# Altium footprint library PcbLib1.PcbLib: 42 footprints (part 2 of 3)
Each footprint in its own frame and in the unit in brackets; x right, y up, seen from the top. Pads: shape width x height; smd on the part's side, far side on the other; paste and mask are expansions set on the pad; w line width, h text height; cw(c..) or ccw(c..) is an arc to the next point about the centre after c.
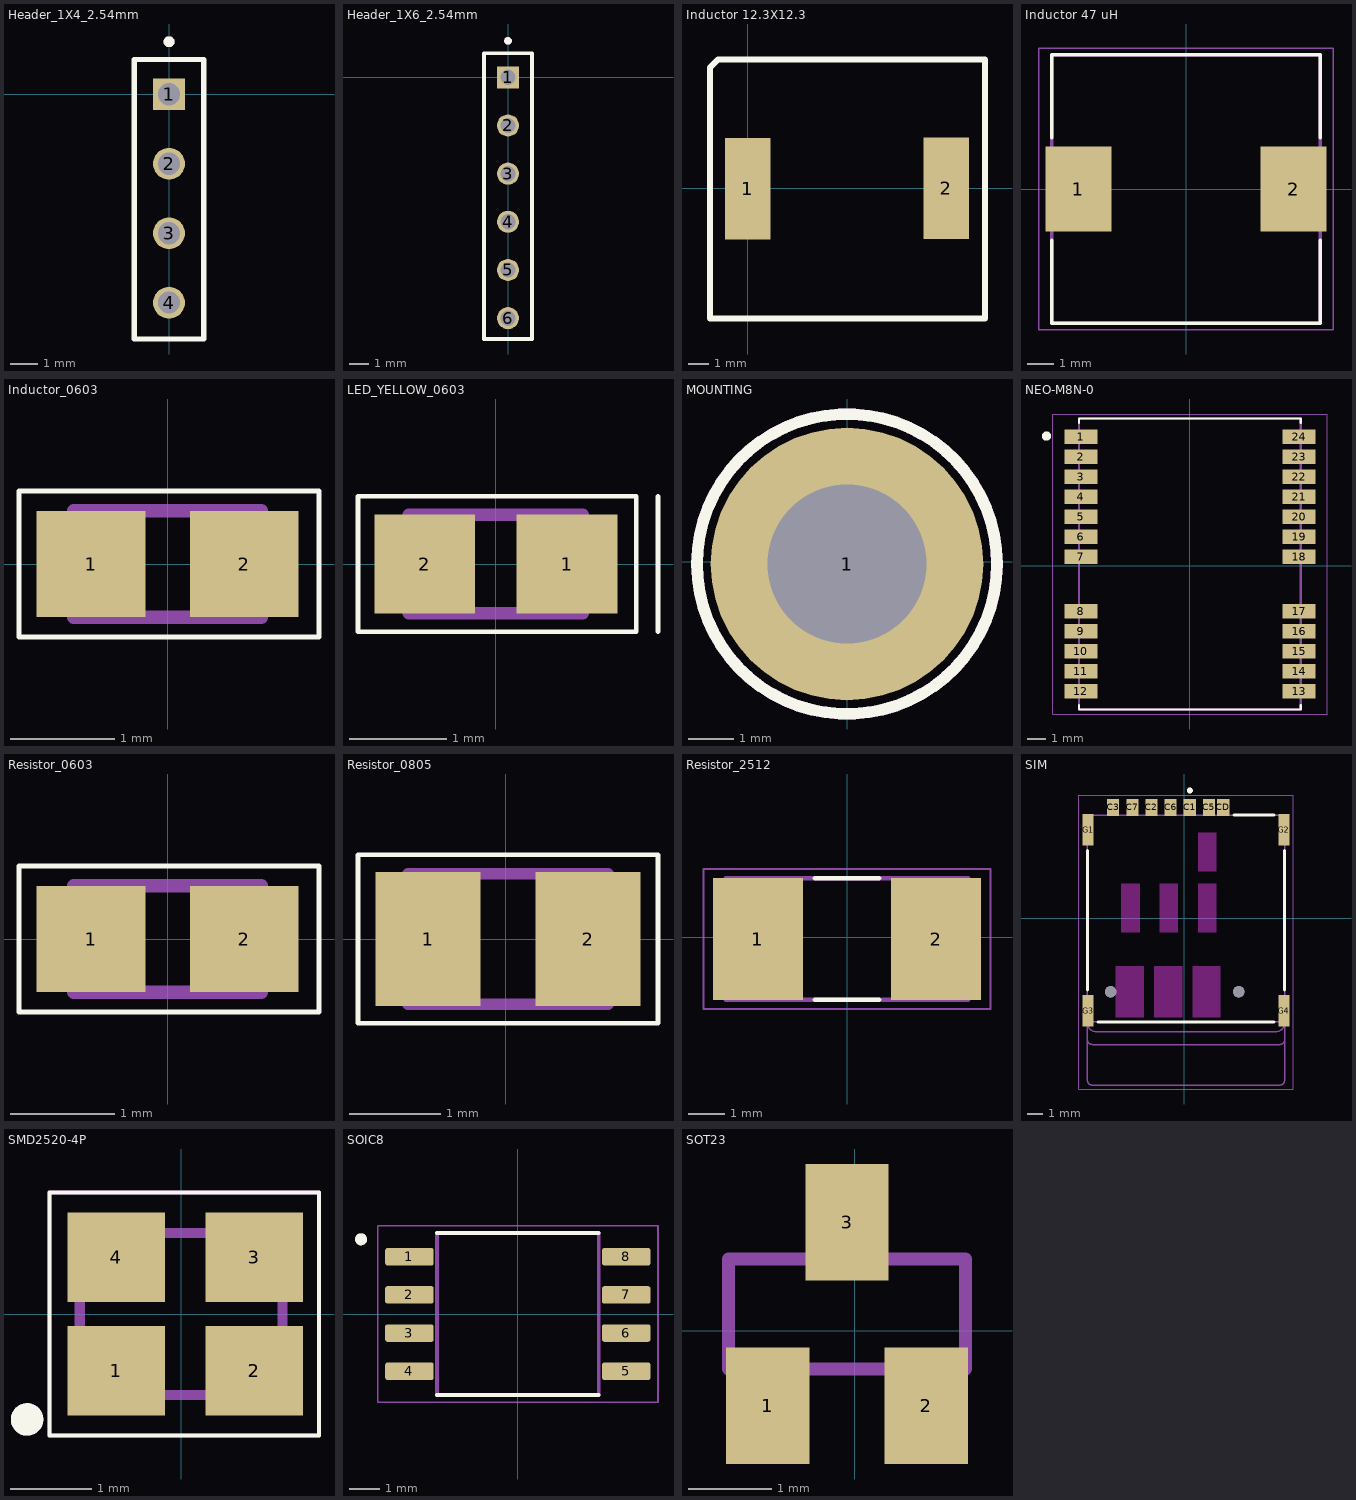
[diagram p1: the footprints below, top view; thin cyan lines are the x and y axes]

## Header_1X4_2.54mm [mil]
pads (4):
  rect 45.78x45.78 / inner round 45.78 / far side rect 45.78x45.78 hole 32: 1(0,0)
  round 45.78 hole 32: 2(0,-100) 3(0,-200) 4(0,-300)
Top Overlay:
  circle w7.87: c0,75.59 r3.94
  lines w7.87: -50,-352.36 -50,50 50,50 50,-352.36 -50,-352.36
Mechanical 1:
  circle w7.87: c0,75.59 r3.94
  lines w3.94: -50,50 50,50 ; -50,50 -50,-352.36 50,-352.36 50,50 ; -50,50 50,50
  text ".Designator" at 3.94,-148.63 h70.87
3D body "61300411121.step": height 317.03, standoff -137.3, extent -50.98,-348.62 49.02,51.38

## Header_1X6_2.54mm [mil]
pads (6):
  rect 45.78x45.78 / inner round 45.78 / far side rect 45.78x45.78 hole 32: 1(0,0)
  round 45.78 hole 32: 2(0,-100) 3(0,-200) 4(0,-300) 5(0,-400) 6(0,-500)
Top Overlay:
  circle w7.87: c0,75.59 r3.94
  lines w7.87: -50,-543.31 -50,50 50,50 50,-543.31 -50,-543.31
Mechanical 1:
  circle w7.87: c0,75.59 r3.94
  lines w3.94: -50,50 50,50 ; -50,50 -50,-543.31 50,-543.31 50,50 ; -50,50 50,50
  text ".Designator" at 3.94,-148.63 h70.87
3D body "022102061.stp": height 438.74, standoff -121.26, extent -43.31,-544.72 49.69,45.28

## Inductor 12.3X12.3 [mm]
pads (2):
  rect 2.2x4.9 smd: 1(0,-0.025) 2(9.6,0)
Top Overlay:
  lines w0.3: -1.825,-6.3 11,-6.3 11.475,-6.3 11.475,6.225 -1.425,6.225 -1.825,5.825 -1.825,-6.3

## Inductor 47 uH [mm]
pads (2):
  rect 2.5x3.2 smd: 1(-4.05,0) 2(4.05,0)
Top Overlay:
  lines w0.127: -5.05,-1.92 -5.05,-5.05 5.05,-5.05 5.05,-1.92 ; -5.05,1.92 -5.05,5.05 5.05,5.05 5.05,1.92
Mechanical 13:
  lines w0.127: -5.05,-5.05 5.05,-5.05 5.05,5.05 -5.05,5.05 -5.05,-5.05
Mechanical 15:
  lines w0.05: -5.55,-5.3 5.55,-5.3 5.55,5.3 -5.55,5.3 -5.55,-5.3
3D body "step_temp.STEP": height 4.8, standoff 0, extent -5.05,-5.05 5.05,5.05

## Inductor_0603 [mm]
pads (2):
  rect 1.04x1.02 smd: 1(-0.735,0) 2(0.735,0)
Top Overlay:
  lines w0.05: -1.425,-0.7 1.45,-0.7 1.45,0.7 -1.425,0.7 -1.425,-0.7
Mechanical 1:
  lines w0.127: -0.9,-0.51 0.9,-0.51 0.9,0.51 -0.9,0.51 -0.9,-0.51
  text ".Designator" at -0.15,-0.15 h1.8
3D body "CircuitWorks-RESISTOR 0603.step": height 0.52, standoff 0.01, extent -0.8,-0.43 0.8,0.43

## LED_YELLOW_0603 [mm]
pads (2):
  rect 1.04x1.02 smd: 1(0.735,0) 2(-0.735,0)
Top Overlay:
  lines w0.05: 1.675,-0.7 1.675,0.7 ; -1.425,-0.7 1.45,-0.7 1.45,0.7 -1.425,0.7 -1.425,-0.7
Mechanical 1:
  lines w0.127: -0.9,-0.51 0.9,-0.51 0.9,0.51 -0.9,0.51 -0.9,-0.51
3D body "LED 0603 SMD-YELLOW.STEP": height 0.55, standoff 0.01, extent -0.8,-0.425 0.8,0.375

## MOUNTING [mm]
pads (1):
  round 6 hole 3.5: 1(0,-0.05)
Top Overlay:
  circle w0.254: c0,-0.05 r3.3
Mechanical 1:
  circle w0.254: c0,-0.05 r3.3

## NEO-M8N-0 [mm]
pads (24):
  rect 1.8x0.8 smd paste-2: 1(-6,7.102) 2(-6,6.002) 3(-6,4.902) 4(-6,3.802) 5(-6,2.702) 6(-6,1.602) 7(-6,0.502) 8(-6,-2.498) 9(-6,-3.598) 10(-6,-4.698) 11(-6,-5.798) 12(-6,-6.898) 13(6,-6.898) 14(6,-5.798) 15(6,-4.698) 16(6,-3.598) 17(6,-2.498) 18(6,0.502) 19(6,1.602) 20(6,2.702) 21(6,3.802) 22(6,4.902) 23(6,6.002) 24(6,7.102)
Top Overlay:
  circle w0.3: c-7.889,7.138 r0.1
  lines w0.127: -6.1,-7.648 -6.1,-7.898 6.1,-7.898 6.1,-7.648 ; -6.1,7.852 -6.1,8.102 6.1,8.102 6.1,7.852
Top Paste:
  drawing of 48 lines, arcs and shapes, not listed
Mechanical 13:
  lines w0.127: -6.1,-7.898 -6.1,8.102 6.1,8.102 6.1,-7.898 -6.1,-7.898
Mechanical 15:
  lines w0.05: -7.55,-8.148 -7.55,8.352 7.55,8.352 7.55,-8.148 -7.55,-8.148
3D body "step_temp.STEP": height 2.6, standoff 0, extent -6.1,-7.898 6.1,8.102

## PCBComponent_1 [mm]

## Resistor_0603 [mm]
pads (2):
  rect 1.04x1.02 smd: 1(-0.735,0) 2(0.735,0)
Top Overlay:
  lines w0.05: -1.425,-0.7 -1.425,0.7 1.45,0.7 1.45,-0.7 -1.425,-0.7
Mechanical 1:
  lines w0.127: -0.9,-0.51 -0.9,0.51 0.9,0.51 0.9,-0.51 -0.9,-0.51
  text ".Designator" at -0.15,-0.15 h1.8
3D body "CircuitWorks-RESISTOR 0603.step": height 0.52, standoff 0.01, extent -0.8,-0.43 0.8,0.43

## Resistor_0805 [mm]
pads (2):
  rect 1.16x1.47 smd: 1(-0.855,0) 2(0.905,0)
Top Overlay:
  lines w0.05: -1.625,-0.925 -1.625,0.925 1.675,0.925 1.675,-0.925 -1.625,-0.925
Mechanical 1:
  lines w0.127: -1.075,-0.72 1.125,-0.72 1.125,0.72 -1.075,0.72 -1.075,-0.72
  text ".Designator" at -0.075,-0.067 h1.8
3D body "CRG0805F1K5.step": height 0.66, standoff 0.01, extent -1,-0.65 1,0.6

## Resistor_2512 [mm]
pads (2):
  rect 2.46x3.32 smd: 1(-2.425,-0.05) 2(2.425,-0.05)
Top Overlay:
  lines w0.127: -0.87,-1.7 0.87,-1.7 ; -0.87,1.6 0.87,1.6
Mechanical 13:
  lines w0.127: -3.3,-1.7 3.3,-1.7 3.3,1.6 -3.3,1.6 -3.3,-1.7
Mechanical 15:
  lines w0.05: -3.908,-1.958 3.908,-1.958 3.908,1.858 -3.908,1.858 -3.908,-1.958
3D body "step_temp.STEP": height 0.75, standoff 0, extent -3.2,-1.6 3.2,1.5

## SIM [mm]
pads (13):
  rect 0.8x1.14 smd: C1(0.35,7.37) C2(-2.19,7.37) C3(-4.73,7.37) C5(1.62,7.37) C6(-0.92,7.37) C7(-3.46,7.37) CD(2.57,7.37)
  rect 0.7x2.1 smd: G1(-6.4,5.89) G2(6.6,5.89) G3(-6.4,-6.11) G4(6.6,-6.11)
  round 0.75 hole 0.75 unplated: ""(-4.9,-4.86) ""(3.6,-4.86)
Top Overlay:
  circle w0.2: c0.35,8.49 r0.1
  lines w0.2: -6.445,-4.74 -6.445,4.52 ; -5.73,-6.86 5.93,-6.86 ; 3.29,6.86 5.93,6.86 ; 6.645,-4.74 6.645,4.52
Keep-Out Layer:
  region: 2.1,3.135 0.9,3.135 0.9,5.685 2.1,5.685
  region: -0.155,-6.56 -2.005,-6.56 -2.005,-3.16 -0.155,-3.16
  region: -2.695,-6.56 -4.545,-6.56 -4.545,-3.16 -2.695,-3.16
  region: 2.385,-6.56 0.535,-6.56 0.535,-3.16 2.385,-3.16
  region: 2.1,-0.915 0.9,-0.915 0.9,2.295 2.1,2.295
  region: -0.44,-0.915 -1.64,-0.915 -1.64,2.295 -0.44,2.295
  region: -2.98,-0.915 -4.18,-0.915 -4.18,2.295 -2.98,2.295
Mechanical 13:
  circle w0.2: c0.35,8.49 r0.1
  lines w0.1: -6.445,-10.713 ccw(c-6.098,-10.713) -6.098,-11.06 ; -6.445,-10.71 -6.445,-8.01 -6.445,-6.86 ; -6.445,-8.013 ccw(c-6.098,-8.013) -6.098,-8.36 ; -6.1,-11.06 6.3,-11.06 ; -6.1,-8.36 6.3,-8.36 ccw(c6.322,-8.037) 6.645,-8.06 ; -5.9,-7.51 6.1,-7.51 ccw(c6.047,-6.913) 6.645,-6.86 ; -5.9,-7.51 cw(c-5.847,-6.913) -6.445,-6.86 ; 6.298,-11.06 ccw(c6.298,-10.713) 6.645,-10.713 ; 6.645,-10.71 6.645,-8.06 ; -6.445,-6.86 -6.445,6.86 6.645,6.86 6.645,-6.86 ; -6.445,-6.86 6.645,-6.86 ; 6.645,-8.06 6.645,-6.86
Mechanical 15:
  lines w0.05: -7,-11.31 -7,8.19 7.2,8.19 7.2,-11.31 -7,-11.31
3D body "SIM8066-6-1-14-01-A.STEP": height 1.44, standoff -0.37, extent -6.545,-6.84 6.545,7.74

## SMD2520-4P [mm]
pads (4):
  rect 1.2x1.1 smd: 1(-0.8,-0.7) 2(0.9,-0.7) 3(0.9,0.7) 4(-0.8,0.7)
Top Overlay:
  circle w0.2: c-1.9,-1.3 r0.1
  lines w0.05: -1.625,-1.5 1.7,-1.5 1.7,1.5 -1.625,1.5 -1.625,-1.5
Mechanical 13:
  circle w0.2: c-1.9,-1.3 r0.1
  lines w0.127: -1.25,-1 1.25,-1 1.25,1 -1.25,1 -1.25,-1
Mechanical 15:
  lines w0.05: -1.625,-1.5 1.7,-1.5 1.7,1.5 -1.625,1.5 -1.625,-1.5
3D body "step_temp.STEP": height 0.9, standoff 0, extent -1.25,-1 1.25,1

## SOIC8 [mm]
pads (8):
  rrect25% 1.61x0.58 smd: 1(-3.605,1.905) 2(-3.605,0.635) 3(-3.605,-0.635) 4(-3.605,-1.905) 5(3.605,-1.905) 6(3.605,-0.635) 7(3.605,0.635) 8(3.605,1.905)
Top Overlay:
  circle w0.2: c-5.215,2.485 r0.1
  lines w0.127: -2.69,-2.69 2.69,-2.69 ; -2.69,2.69 2.69,2.69
Mechanical 13:
  circle w0.2: c-5.215,2.485 r0.1
  lines w0.127: -2.69,-2.69 2.69,-2.69 2.69,2.69 -2.69,2.69 -2.69,-2.69
Mechanical 15:
  lines w0.05: -4.66,-2.94 4.66,-2.94 4.66,2.94 -4.66,2.94 -4.66,-2.94
3D body "step_temp.STEP": height 2.16, standoff 0, extent -3.95,-2.64 3.95,2.64

## SOT23 [mm]
pads (3):
  rect 1x1.4 smd: 1(-1.044,-0.897) 2(0.856,-0.897) 3(-0.094,1.303)
Mechanical 13:
  region: 0.135,0.914 -0.323,0.914 -0.323,1.498 0.135,1.498
  region: 1.074,-1.092 0.617,-1.092 0.617,-0.508 1.074,-0.508
  region: -0.805,-1.092 -1.262,-1.092 -1.262,-0.508 -0.805,-0.508
  lines w0.152: -1.516,-0.457 1.328,-0.457 1.328,0.863 -1.516,0.863 -1.516,-0.457
3D body "step_temp.STEP": height 1.25, standoff 0, extent -1.55,-1.275 1.35,1.525